# Altium footprint library Molex FFC - FPC Connectors (SMT).PcbLib: 638 footprints (part 11 of 40)
Each footprint in its own frame and in the unit in brackets; x right, y up, seen from the top. Pads: shape width x height; smd on the part's side, far side on the other; paste and mask are expansions set on the pad; w line width, h text height; cw(c..) or ccw(c..) is an arc to the next point about the centre after c.
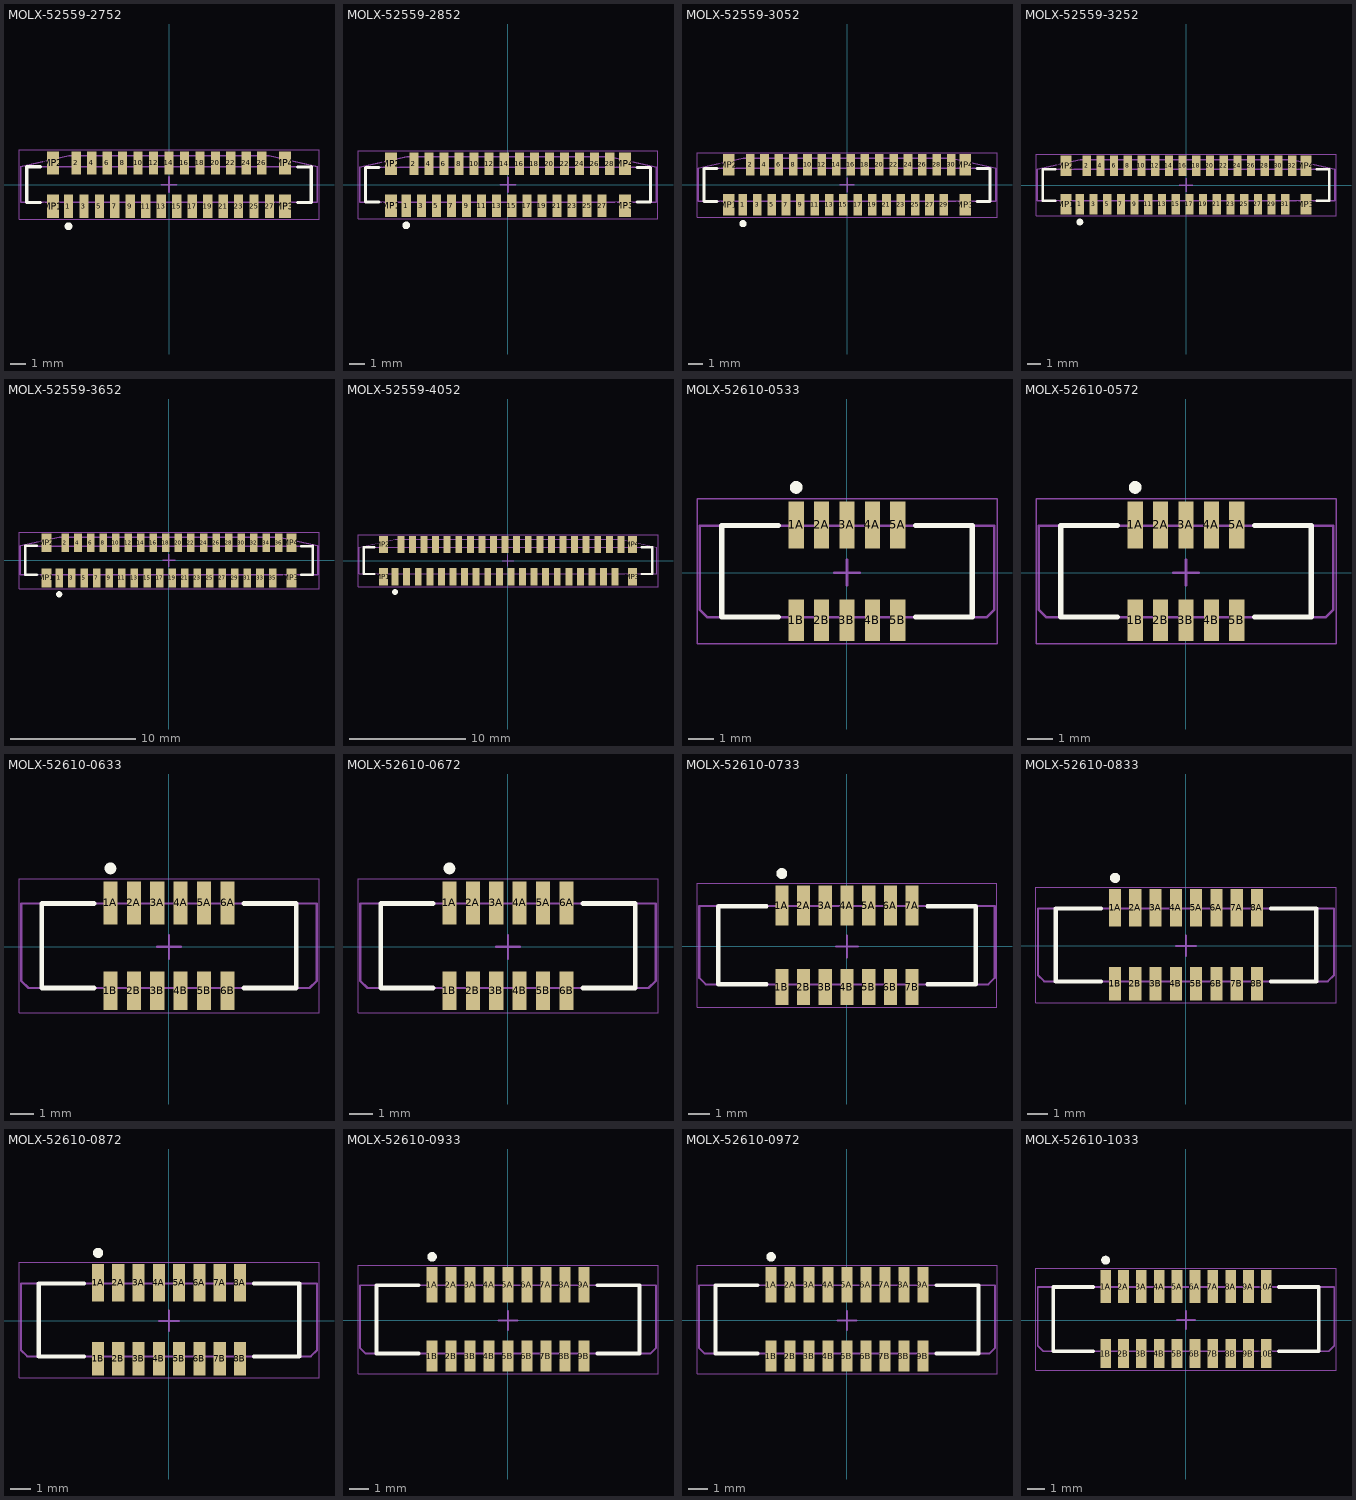
[diagram p10: the footprints below, top view; thin cyan lines are the x and y axes]

## MOLX-52559-2752 [mm] "FPC Connector, 27-Leads, Vertical, Pitch 0.5 mm, Mated Height 3.9 mm, SMT"
height 5.3
pads (31):
  rect 0.6x1.5 smd: 1(-6.5,-1.4) 2(-6,1.4) 3(-5.5,-1.4) 4(-5,1.4) 5(-4.5,-1.4) 6(-4,1.4) 7(-3.5,-1.4) 8(-3,1.4) 9(-2.5,-1.4) 10(-2,1.4) 11(-1.5,-1.4) 12(-1,1.4) 13(-0.5,-1.4) 14(0,1.4) 15(0.5,-1.4) 16(1,1.4) 17(1.5,-1.4) 18(2,1.4) 19(2.5,-1.4) 20(3,1.4) 21(3.5,-1.4) 22(4,1.4) 23(4.5,-1.4) 24(5,1.4) 25(5.5,-1.4) 26(6,1.4) 27(6.5,-1.4)
  rect 0.8x1.5 smd: MP1(-7.5,-1.4) MP2(-7.5,1.4) MP3(7.5,-1.4) MP4(7.5,1.4)
Top Overlay:
  circle w0.25: c-6.5,-2.7 r0.125
  lines w0.2: -9.2,1.15 -8.3,1.15 ; -9.2,1.15 -9.2,-1.15 ; -8.3,-1.15 -9.2,-1.15 ; 8.3,1.143 9.193,1.143 ; 8.3,-1.15 9.2,-1.15 9.2,1.15 ; -9.2,-1.15 -9.2,-1.15
Mechanical 13:
  lines w0.1: -9.2,-1.15 -9.2,1.15 ; -9.2,1.143 9.193,1.143 ; 9.2,-1.15 9.2,1.15 ; -9.6,-1.15 -9.6,1.15 -6.475,1.85 6.475,1.85 9.6,1.15 9.6,-1.15 7.075,-1.15 -7.075,-1.15 -9.6,-1.15
Mechanical 15:
  lines w0.05: -9.7,-2.25 9.7,-2.25 9.7,2.25 -9.7,2.25 -9.7,-2.25
  lines w0.1: -0.5,0 0.5,0 ; 0,-0.5 0,0.5
3D body: height 0.25, standoff 0, extent -9.6,-1.65 9.6,1.85

## MOLX-52559-2852 [mm] "FPC Connector, 28-Leads, Vertical, Pitch 0.5 mm, Mated Height 3.9 mm, SMT"
height 5.3
pads (32):
  rect 0.6x1.5 smd: 1(-6.75,-1.4) 2(-6.25,1.4) 3(-5.75,-1.4) 4(-5.25,1.4) 5(-4.75,-1.4) 6(-4.25,1.4) 7(-3.75,-1.4) 8(-3.25,1.4) 9(-2.75,-1.4) 10(-2.25,1.4) 11(-1.75,-1.4) 12(-1.25,1.4) 13(-0.75,-1.4) 14(-0.25,1.4) 15(0.25,-1.4) 16(0.75,1.4) 17(1.25,-1.4) 18(1.75,1.4) 19(2.25,-1.4) 20(2.75,1.4) 21(3.25,-1.4) 22(3.75,1.4) 23(4.25,-1.4) 24(4.75,1.4) 25(5.25,-1.4) 26(5.75,1.4) 27(6.25,-1.4) 28(6.75,1.4)
  rect 0.8x1.5 smd: MP1(-7.75,-1.4) MP2(-7.75,1.4) MP3(7.75,-1.4) MP4(7.75,1.4)
Top Overlay:
  circle w0.25: c-6.75,-2.7 r0.125
  lines w0.2: -9.45,1.15 -9.45,-1.15 -8.55,-1.15 ; -9.45,1.15 -8.55,1.15 ; 8.55,-1.15 9.45,-1.15 9.45,1.15 ; 8.55,1.15 9.45,1.15
Mechanical 13:
  lines w0.1: -9.45,-1.15 -9.45,1.15 9.45,1.15 9.45,-1.15 ; 7.325,-1.15 -7.55,-1.15 -9.85,-1.15 -9.85,1.15 -6.725,1.85 6.725,1.85 9.85,1.15 9.85,-1.15 7.325,-1.15 ; 7.325,-1.15 7.325,-1.15
Mechanical 15:
  lines w0.05: -9.95,-2.25 -9.95,2.25 9.95,2.25 9.95,-2.25 -9.95,-2.25
  lines w0.1: -0.5,0 0.5,0 ; 0,-0.5 0,0.5
3D body: height 0.25, standoff 0, extent -9.85,-1.65 9.85,1.85

## MOLX-52559-3052 [mm] "FPC Connector, 30-Leads, Vertical, Pitch 0.5 mm, Mated Height 3.9 mm, SMT"
height 5.3
pads (34):
  rect 0.6x1.5 smd: 1(-7.25,-1.4) 2(-6.75,1.4) 3(-6.25,-1.4) 4(-5.75,1.4) 5(-5.25,-1.4) 6(-4.75,1.4) 7(-4.25,-1.4) 8(-3.75,1.4) 9(-3.25,-1.4) 10(-2.75,1.4) 11(-2.25,-1.4) 12(-1.75,1.4) 13(-1.25,-1.4) 14(-0.75,1.4) 15(-0.25,-1.4) 16(0.25,1.4) 17(0.75,-1.4) 18(1.25,1.4) 19(1.75,-1.4) 20(2.25,1.4) 21(2.75,-1.4) 22(3.25,1.4) 23(3.75,-1.4) 24(4.25,1.4) 25(4.75,-1.4) 26(5.25,1.4) 27(5.75,-1.4) 28(6.25,1.4) 29(6.75,-1.4) 30(7.25,1.4)
  rect 0.8x1.5 smd: MP1(-8.25,-1.4) MP2(-8.25,1.4) MP3(8.25,-1.4) MP4(8.25,1.4)
Top Overlay:
  circle w0.25: c-7.25,-2.7 r0.125
  lines w0.2: -9.95,1.15 -9.95,-1.15 -9.05,-1.15 ; -9.95,1.15 -9.05,1.15 ; 9.05,-1.15 9.95,-1.15 9.95,1.15 ; 9.05,1.15 9.95,1.15
Mechanical 13:
  lines w0.1: -9.95,-1.15 -9.95,1.15 9.95,1.15 9.95,-1.15 ; -10.35,-1.15 -8.075,-1.15 7.825,-1.15 10.35,-1.15 10.35,1.15 7.225,1.85 -7.225,1.85 -10.35,1.15 -10.35,-1.15
Mechanical 15:
  lines w0.05: -10.45,-2.25 10.45,-2.25 10.45,2.25 -10.45,2.25 -10.45,-2.25
  lines w0.1: -0.5,0 0.5,0 ; 0,-0.5 0,0.5
3D body: height 0.25, standoff 0, extent -10.35,-1.65 10.35,1.85

## MOLX-52559-3252 [mm] "FPC Connector, 32-Leads, Vertical, Pitch 0.5 mm, Mated Height 3.9 mm, SMT"
height 5.3
pads (36):
  rect 0.6x1.5 smd: 1(-7.75,-1.4) 2(-7.25,1.4) 3(-6.75,-1.4) 4(-6.25,1.4) 5(-5.75,-1.4) 6(-5.25,1.4) 7(-4.75,-1.4) 8(-4.25,1.4) 9(-3.75,-1.4) 10(-3.25,1.4) 11(-2.75,-1.4) 12(-2.25,1.4) 13(-1.75,-1.4) 14(-1.25,1.4) 15(-0.75,-1.4) 16(-0.25,1.4) 17(0.25,-1.4) 18(0.75,1.4) 19(1.25,-1.4) 20(1.75,1.4) 21(2.25,-1.4) 22(2.75,1.4) 23(3.25,-1.4) 24(3.75,1.4) 25(4.25,-1.4) 26(4.75,1.4) 27(5.25,-1.4) 28(5.75,1.4) 29(6.25,-1.4) 30(6.75,1.4) 31(7.25,-1.4) 32(7.75,1.4)
  rect 0.8x1.5 smd: MP1(-8.75,-1.4) MP2(-8.75,1.4) MP3(8.75,-1.4) MP4(8.75,1.4)
Top Overlay:
  circle w0.25: c-7.75,-2.7 r0.125
  lines w0.2: -9.55,-1.15 -10.45,-1.15 -10.45,1.15 -9.55,1.15 ; 9.55,-1.15 10.45,-1.15 10.45,1.15 9.55,1.15
Mechanical 13:
  lines w0.1: -10.45,-1.15 -10.45,1.15 10.45,1.15 10.45,-1.15 ; -10.85,-1.15 -8.55,-1.15 8.325,-1.15 10.85,-1.15 10.85,1.15 7.725,1.85 -7.725,1.85 -10.85,1.15 -10.85,-1.15
Mechanical 15:
  lines w0.05: -10.95,-2.25 10.95,-2.25 10.95,2.25 -10.95,2.25 -10.95,-2.25
  lines w0.1: -0.5,0 0.5,0 ; 0,-0.5 0,0.5
3D body: height 0.25, standoff 0, extent -10.85,-1.65 10.85,1.85

## MOLX-52559-3652 [mm] "FPC Connector, 36-Leads, Vertical, Pitch 0.5 mm, Mated Height 3.9 mm, SMT"
height 5.3
pads (40):
  rect 0.6x1.5 smd: 1(-8.75,-1.4) 2(-8.25,1.4) 3(-7.75,-1.4) 4(-7.25,1.4) 5(-6.75,-1.4) 6(-6.25,1.4) 7(-5.75,-1.4) 8(-5.25,1.4) 9(-4.75,-1.4) 10(-4.25,1.4) 11(-3.75,-1.4) 12(-3.25,1.4) 13(-2.75,-1.4) 14(-2.25,1.4) 15(-1.75,-1.4) 16(-1.25,1.4) 17(-0.75,-1.4) 18(-0.25,1.4) 19(0.25,-1.4) 20(0.75,1.4) 21(1.25,-1.4) 22(1.75,1.4) 23(2.25,-1.4) 24(2.75,1.4) 25(3.25,-1.4) 26(3.75,1.4) 27(4.25,-1.4) 28(4.75,1.4) 29(5.25,-1.4) 30(5.75,1.4) 31(6.25,-1.4) 32(6.75,1.4) 33(7.25,-1.4) 34(7.75,1.4) 35(8.25,-1.4) 36(8.75,1.4)
  rect 0.8x1.5 smd: MP1(-9.75,-1.4) MP2(-9.75,1.4) MP3(9.75,-1.4) MP4(9.75,1.4)
Top Overlay:
  circle w0.25: c-8.75,-2.7 r0.125
  lines w0.2: -10.55,-1.15 -11.45,-1.15 -11.45,1.15 -10.55,1.15 ; 10.55,-1.15 11.45,-1.15 11.45,1.15 ; 10.55,1.143 11.443,1.143
Mechanical 13:
  lines w0.1: -11.443,-1.143 -11.443,1.143 11.45,1.143 ; 11.45,-1.15 11.45,1.15 ; -11.85,-1.15 11.85,-1.15 11.85,1.15 8.725,1.85 -8.725,1.85 -11.85,1.15 -11.85,-1.15
Mechanical 15:
  lines w0.05: -11.95,-2.25 -11.95,2.25 11.95,2.25 11.95,-2.25 -11.95,-2.25
  lines w0.1: -0.5,0 0.5,0 ; 0,-0.5 0,0.5
3D body: height 0.25, standoff 0, extent -11.85,-1.65 11.85,1.85

## MOLX-52559-4052 [mm] "FPC Connector, 40-Leads, Vertical, Pitch 0.5 mm, Mated Height 3.9 mm, SMT"
height 5.3
pads (44):
  rect 0.6x1.5 smd: 1(-9.75,-1.4) 2(-9.25,1.4) 3(-8.75,-1.4) 4(-8.25,1.4) 5(-7.75,-1.4) 6(-7.25,1.4) 7(-6.75,-1.4) 8(-6.25,1.4) 9(-5.75,-1.4) 10(-5.25,1.4) 11(-4.75,-1.4) 12(-4.25,1.4) 13(-3.75,-1.4) 14(-3.25,1.4) 15(-2.75,-1.4) 16(-2.25,1.4) 17(-1.75,-1.4) 18(-1.25,1.4) 19(-0.75,-1.4) 20(-0.25,1.4) 21(0.25,-1.4) 22(0.75,1.4) 23(1.25,-1.4) 24(1.75,1.4) 25(2.25,-1.4) 26(2.75,1.4) 27(3.25,-1.4) 28(3.75,1.4) 29(4.25,-1.4) 30(4.75,1.4) 31(5.25,-1.4) 32(5.75,1.4) 33(6.25,-1.4) 34(6.75,1.4) 35(7.25,-1.4) 36(7.75,1.4) 37(8.25,-1.4) 38(8.75,1.4) 39(9.25,-1.4) 40(9.75,1.4)
  rect 0.8x1.5 smd: MP1(-10.75,-1.4) MP2(-10.75,1.4) MP3(10.75,-1.4) MP4(10.75,1.4)
Top Overlay:
  circle w0.25: c-9.75,-2.7 r0.125
  lines w0.2: -12.45,-1.15 -12.45,1.15 -11.55,1.15 ; -12.442,-1.15 -11.55,-1.15 ; 11.55,1.15 12.45,1.15 12.45,-1.15 11.55,-1.15
Mechanical 13:
  lines w0.1: -12.442,-1.15 -12.442,1.142 -12.434,1.15 12.45,1.15 12.45,-1.15 ; -12.85,-1.15 -12.85,1.15 -9.725,1.85 9.725,1.85 12.85,1.15 12.85,-1.15 -12.85,-1.15
Mechanical 15:
  lines w0.05: -12.95,-2.25 -12.95,2.25 12.95,2.25 12.95,-2.25 -12.95,-2.25
  lines w0.1: -0.5,0 0.5,0 ; 0,-0.5 0,0.5
3D body: height 0.25, standoff 0, extent -12.85,-1.65 12.85,1.85

## MOLX-52610-0533 [mm] "FPC Connector, 5-Leads, Vertical, Pitch 1.0 mm, Mated Height 5.75 mm, SMT"
height 5.762
pads (10):
  rect 0.6x1.85 smd: 1A(-2,1.875) 2A(-1,1.875) 3A(0,1.875) 4A(1,1.875) 5A(2,1.875)
  rect 0.6x1.65 smd: 1B(-2,-1.875) 2B(-1,-1.875) 3B(0,-1.875) 4B(1,-1.875) 5B(2,-1.875)
Top Overlay:
  circle w0.25: c-2,3.35 r0.125
  lines w0.2: -2.7,-1.75 -4.925,-1.75 -4.925,1.85 -2.7,1.85 ; 2.7,-1.75 4.925,-1.75 4.925,1.85 2.7,1.85
Mechanical 13:
  lines w0.1: -4.925,-1.75 -4.925,1.85 ; 4.925,-1.75 4.925,1.85 ; -5.8,-1.45 -5.8,1.85 5.8,1.85 5.8,-1.45 5.5,-1.75 -5.5,-1.75 -5.8,-1.45
Mechanical 15:
  lines w0.05: -5.9,-2.8 -5.9,2.9 5.9,2.9 5.9,-2.8 -5.9,-2.8
  lines w0.1: -0.5,0 0.5,0 ; 0,-0.5 0,0.5
3D body: height 0.25, standoff 0, extent -5.8,-2.24 5.8,2.26

## MOLX-52610-0572 [mm] "FPC Connector, 5-Leads, Vertical, Pitch 1.0 mm, Mated Height 5.75 mm, SMT"
height 5.762
pads (10):
  rect 0.6x1.85 smd: 1A(-2,1.875) 2A(-1,1.875) 3A(0,1.875) 4A(1,1.875) 5A(2,1.875)
  rect 0.6x1.65 smd: 1B(-2,-1.875) 2B(-1,-1.875) 3B(0,-1.875) 4B(1,-1.875) 5B(2,-1.875)
Top Overlay:
  circle w0.25: c-2,3.35 r0.125
  lines w0.2: -2.7,-1.75 -4.925,-1.75 -4.925,1.85 -2.7,1.85 ; 2.7,-1.75 4.925,-1.75 4.925,1.85 2.7,1.85
Mechanical 13:
  lines w0.1: -4.925,-1.75 -4.925,1.85 ; 4.925,-1.75 4.925,1.85 ; -5.8,-1.45 -5.5,-1.75 5.5,-1.75 5.8,-1.45 5.8,1.85 -5.8,1.85 -5.8,-1.45
Mechanical 15:
  lines w0.05: -5.9,-2.8 5.9,-2.8 5.9,2.9 -5.9,2.9 -5.9,-2.8
  lines w0.1: -0.5,0 0.5,0 ; 0,-0.5 0,0.5
3D body: height 0.25, standoff 0, extent -5.8,-2.24 5.8,2.26

## MOLX-52610-0633 [mm] "FPC Connector, 6-Leads, Vertical, Pitch 1.0 mm, Mated Height 5.75 mm, SMT"
height 5.762
pads (12):
  rect 0.6x1.85 smd: 1A(-2.5,1.875) 2A(-1.5,1.875) 3A(-0.5,1.875) 4A(0.5,1.875) 5A(1.5,1.875) 6A(2.5,1.875)
  rect 0.6x1.65 smd: 1B(-2.5,-1.875) 2B(-1.5,-1.875) 3B(-0.5,-1.875) 4B(0.5,-1.875) 5B(1.5,-1.875) 6B(2.5,-1.875)
Top Overlay:
  circle w0.25: c-2.5,3.35 r0.125
  lines w0.2: -3.2,-1.75 -5.425,-1.75 -5.425,1.85 -3.2,1.85 ; 3.2,-1.75 5.425,-1.75 5.425,1.85 3.2,1.85
Mechanical 13:
  lines w0.1: -5.425,-1.75 -5.425,1.85 ; 5.425,-1.75 5.425,1.85 ; -6.3,-1.45 -6.3,1.85 6.3,1.85 6.3,-1.45 6,-1.75 -6,-1.75 -6.3,-1.45
Mechanical 15:
  lines w0.05: -6.4,-2.8 -6.4,2.9 6.4,2.9 6.4,-2.8 -6.4,-2.8
  lines w0.1: -0.5,0 0.5,0 ; 0,-0.5 0,0.5
3D body: height 0.25, standoff 0, extent -6.3,-2.24 6.3,2.26

## MOLX-52610-0672 [mm] "FPC Connector, 6-Leads, Vertical, Pitch 1.0 mm, Mated Height 5.75 mm, SMT"
height 5.762
pads (12):
  rect 0.6x1.85 smd: 1A(-2.5,1.875) 2A(-1.5,1.875) 3A(-0.5,1.875) 4A(0.5,1.875) 5A(1.5,1.875) 6A(2.5,1.875)
  rect 0.6x1.65 smd: 1B(-2.5,-1.875) 2B(-1.5,-1.875) 3B(-0.5,-1.875) 4B(0.5,-1.875) 5B(1.5,-1.875) 6B(2.5,-1.875)
Top Overlay:
  circle w0.25: c-2.5,3.35 r0.125
  lines w0.2: -3.2,-1.75 -5.425,-1.75 -5.425,1.85 -3.2,1.85 ; 3.2,-1.75 5.425,-1.75 5.425,1.85 3.2,1.85
Mechanical 13:
  lines w0.1: -5.425,-1.75 -5.425,1.85 ; 5.425,-1.75 5.425,1.85 ; -6.3,-1.45 -6.3,1.85 6.3,1.85 6.3,-1.45 6,-1.75 -6,-1.75 -6.3,-1.45
Mechanical 15:
  lines w0.05: -6.4,-2.8 -6.4,2.9 6.4,2.9 6.4,-2.8 -6.4,-2.8
  lines w0.1: -0.5,0 0.5,0 ; 0,-0.5 0,0.5
3D body: height 0.25, standoff 0, extent -6.3,-2.24 6.3,2.26

## MOLX-52610-0733 [mm] "FPC Connector, 7-Leads, Vertical, Pitch 1.0 mm, Mated Height 5.75 mm, SMT"
height 5.762
pads (14):
  rect 0.6x1.85 smd: 1A(-3,1.875) 2A(-2,1.875) 3A(-1,1.875) 4A(0,1.875) 5A(1,1.875) 6A(2,1.875) 7A(3,1.875)
  rect 0.6x1.65 smd: 1B(-3,-1.875) 2B(-2,-1.875) 3B(-1,-1.875) 4B(0,-1.875) 5B(1,-1.875) 6B(2,-1.875) 7B(3,-1.875)
Top Overlay:
  circle w0.25: c-3,3.35 r0.125
  lines w0.2: -3.7,-1.75 -5.925,-1.75 -5.925,1.85 -3.7,1.85 ; 3.7,-1.75 5.925,-1.75 5.925,1.85 3.7,1.85
Mechanical 13:
  lines w0.1: -5.925,-1.75 -5.925,1.85 ; 5.925,-1.75 5.925,1.85 ; -6.8,-1.45 -6.8,1.85 6.8,1.85 6.8,-1.45 6.5,-1.75 -6.5,-1.75 -6.8,-1.45
Mechanical 15:
  lines w0.05: -6.9,-2.8 -6.9,2.9 6.9,2.9 6.9,-2.8 -6.9,-2.8
  lines w0.1: -0.5,0 0.5,0 ; 0,-0.5 0,0.5
3D body: height 0.25, standoff 0, extent -6.8,-2.24 6.8,2.26

## MOLX-52610-0833 [mm] "FPC Connector, 8-Leads, Vertical, Pitch 1.0 mm, Mated Height 5.75 mm, SMT"
height 5.762
pads (16):
  rect 0.6x1.85 smd: 1A(-3.5,1.875) 2A(-2.5,1.875) 3A(-1.5,1.875) 4A(-0.5,1.875) 5A(0.5,1.875) 6A(1.5,1.875) 7A(2.5,1.875) 8A(3.5,1.875)
  rect 0.6x1.65 smd: 1B(-3.5,-1.875) 2B(-2.5,-1.875) 3B(-1.5,-1.875) 4B(-0.5,-1.875) 5B(0.5,-1.875) 6B(1.5,-1.875) 7B(2.5,-1.875) 8B(3.5,-1.875)
Top Overlay:
  circle w0.25: c-3.5,3.35 r0.125
  lines w0.2: -4.2,-1.75 -6.425,-1.75 -6.425,1.85 -4.2,1.85 ; 4.2,-1.75 6.425,-1.75 6.425,1.85 4.2,1.85
Mechanical 13:
  lines w0.1: -6.425,-1.75 -6.425,1.85 ; 6.425,-1.75 6.425,1.85 ; -7.3,-1.45 -7.3,1.85 7.3,1.85 7.3,-1.45 7,-1.75 -7,-1.75 -7.3,-1.45
Mechanical 15:
  lines w0.05: -7.4,-2.8 -7.4,2.9 7.4,2.9 7.4,-2.8 -7.4,-2.8
  lines w0.1: -0.5,0 0.5,0 ; 0,-0.5 0,0.5
3D body: height 0.25, standoff 0, extent -7.3,-2.24 7.3,2.26

## MOLX-52610-0872 [mm] "FPC Connector, 8-Leads, Vertical, Pitch 1.0 mm, Mated Height 5.75 mm, SMT"
height 5.762
pads (16):
  rect 0.6x1.85 smd: 1A(-3.5,1.875) 2A(-2.5,1.875) 3A(-1.5,1.875) 4A(-0.5,1.875) 5A(0.5,1.875) 6A(1.5,1.875) 7A(2.5,1.875) 8A(3.5,1.875)
  rect 0.6x1.65 smd: 1B(-3.5,-1.875) 2B(-2.5,-1.875) 3B(-1.5,-1.875) 4B(-0.5,-1.875) 5B(0.5,-1.875) 6B(1.5,-1.875) 7B(2.5,-1.875) 8B(3.5,-1.875)
Top Overlay:
  circle w0.25: c-3.5,3.35 r0.125
  lines w0.2: -4.2,-1.75 -6.425,-1.75 -6.425,1.85 -4.2,1.85 ; 4.2,-1.75 6.425,-1.75 6.425,1.85 4.2,1.85
Mechanical 13:
  lines w0.1: -6.425,-1.75 -6.425,1.85 ; 6.425,-1.75 6.425,1.85 ; -7.3,-1.45 -7.3,1.85 7.3,1.85 7.3,-1.45 7,-1.75 -7,-1.75 -7.3,-1.45
Mechanical 15:
  lines w0.05: -7.4,-2.8 -7.4,2.9 7.4,2.9 7.4,-2.8 -7.4,-2.8
  lines w0.1: -0.5,0 0.5,0 ; 0,-0.5 0,0.5
3D body: height 0.25, standoff 0, extent -7.3,-2.24 7.3,2.26

## MOLX-52610-0933 [mm] "FPC Connector, 9-Leads, Vertical, Pitch 1.0 mm, Mated Height 5.75 mm, SMT"
height 5.762
pads (18):
  rect 0.6x1.85 smd: 1A(-4,1.875) 2A(-3,1.875) 3A(-2,1.875) 4A(-1,1.875) 5A(0,1.875) 6A(1,1.875) 7A(2,1.875) 8A(3,1.875) 9A(4,1.875)
  rect 0.6x1.65 smd: 1B(-4,-1.875) 2B(-3,-1.875) 3B(-2,-1.875) 4B(-1,-1.875) 5B(0,-1.875) 6B(1,-1.875) 7B(2,-1.875) 8B(3,-1.875) 9B(4,-1.875)
Top Overlay:
  circle w0.25: c-4,3.35 r0.125
  lines w0.2: -4.7,-1.75 -6.925,-1.75 -6.925,1.85 -4.7,1.85 ; 4.7,-1.75 6.925,-1.75 6.925,1.85 4.7,1.85
Mechanical 13:
  lines w0.1: -6.925,-1.75 -6.925,1.85 ; 6.925,-1.75 6.925,1.85 ; -7.8,-1.45 -7.5,-1.75 7.5,-1.75 7.8,-1.45 7.8,1.85 -7.8,1.85 -7.8,-1.45
Mechanical 15:
  lines w0.05: -7.9,-2.8 7.9,-2.8 7.9,2.9 -7.9,2.9 -7.9,-2.8
  lines w0.1: -0.5,0 0.5,0 ; 0,-0.5 0,0.5
3D body: height 0.25, standoff 0, extent -7.8,-2.24 7.8,2.26

## MOLX-52610-0972 [mm] "FPC Connector, 9-Leads, Vertical, Pitch 1.0 mm, Mated Height 5.75 mm, SMT"
height 5.762
pads (18):
  rect 0.6x1.85 smd: 1A(-4,1.875) 2A(-3,1.875) 3A(-2,1.875) 4A(-1,1.875) 5A(0,1.875) 6A(1,1.875) 7A(2,1.875) 8A(3,1.875) 9A(4,1.875)
  rect 0.6x1.65 smd: 1B(-4,-1.875) 2B(-3,-1.875) 3B(-2,-1.875) 4B(-1,-1.875) 5B(0,-1.875) 6B(1,-1.875) 7B(2,-1.875) 8B(3,-1.875) 9B(4,-1.875)
Top Overlay:
  circle w0.25: c-4,3.35 r0.125
  lines w0.2: -4.7,-1.75 -6.925,-1.75 -6.925,1.85 -4.7,1.85 ; 4.7,-1.75 6.925,-1.75 6.925,1.85 4.7,1.85
Mechanical 13:
  lines w0.1: -6.925,-1.75 -6.925,1.85 ; 6.925,-1.75 6.925,1.85 ; -7.8,-1.45 -7.8,1.85 7.8,1.85 7.8,-1.45 7.5,-1.75 -7.5,-1.75 -7.8,-1.45
Mechanical 15:
  lines w0.05: -7.9,-2.8 -7.9,2.9 7.9,2.9 7.9,-2.8 -7.9,-2.8
  lines w0.1: -0.5,0 0.5,0 ; 0,-0.5 0,0.5
3D body: height 0.25, standoff 0, extent -7.8,-2.24 7.8,2.26

## MOLX-52610-1033 [mm] "FPC Connector, 10-Leads, Vertical, Pitch 1.0 mm, Mated Height 5.75 mm, SMT"
height 5.762
pads (20):
  rect 0.6x1.85 smd: 1A(-4.5,1.875) 2A(-3.5,1.875) 3A(-2.5,1.875) 4A(-1.5,1.875) 5A(-0.5,1.875) 6A(0.5,1.875) 7A(1.5,1.875) 8A(2.5,1.875) 9A(3.5,1.875) 10A(4.5,1.875)
  rect 0.6x1.65 smd: 1B(-4.5,-1.875) 2B(-3.5,-1.875) 3B(-2.5,-1.875) 4B(-1.5,-1.875) 5B(-0.5,-1.875) 6B(0.5,-1.875) 7B(1.5,-1.875) 8B(2.5,-1.875) 9B(3.5,-1.875) 10B(4.5,-1.875)
Top Overlay:
  circle w0.25: c-4.5,3.35 r0.125
  lines w0.2: -5.2,-1.75 -7.425,-1.75 -7.425,1.85 -5.2,1.85 ; 5.2,1.85 7.425,1.85 7.425,-1.75 5.2,-1.75
Mechanical 13:
  lines w0.1: -7.425,-1.75 -7.425,1.85 ; 7.425,-1.75 7.425,1.85 ; -8.3,-1.45 -8,-1.75 8,-1.75 8.3,-1.45 8.3,1.85 -8.3,1.85 -8.3,-1.45
Mechanical 15:
  lines w0.05: -8.4,-2.8 8.4,-2.8 8.4,2.9 -8.4,2.9 -8.4,-2.8
  lines w0.1: -0.5,0 0.5,0 ; 0,-0.5 0,0.5
3D body: height 0.25, standoff 0, extent -8.3,-2.24 8.3,2.26